# Altium footprint library Mylib.PcbLib: 294 footprints (part 2 of 19)
Each footprint in its own frame and in the unit in brackets; x right, y up, seen from the top. Pads: shape width x height; smd on the part's side, far side on the other; paste and mask are expansions set on the pad; w line width, h text height; cw(c..) or ccw(c..) is an arc to the next point about the centre after c.
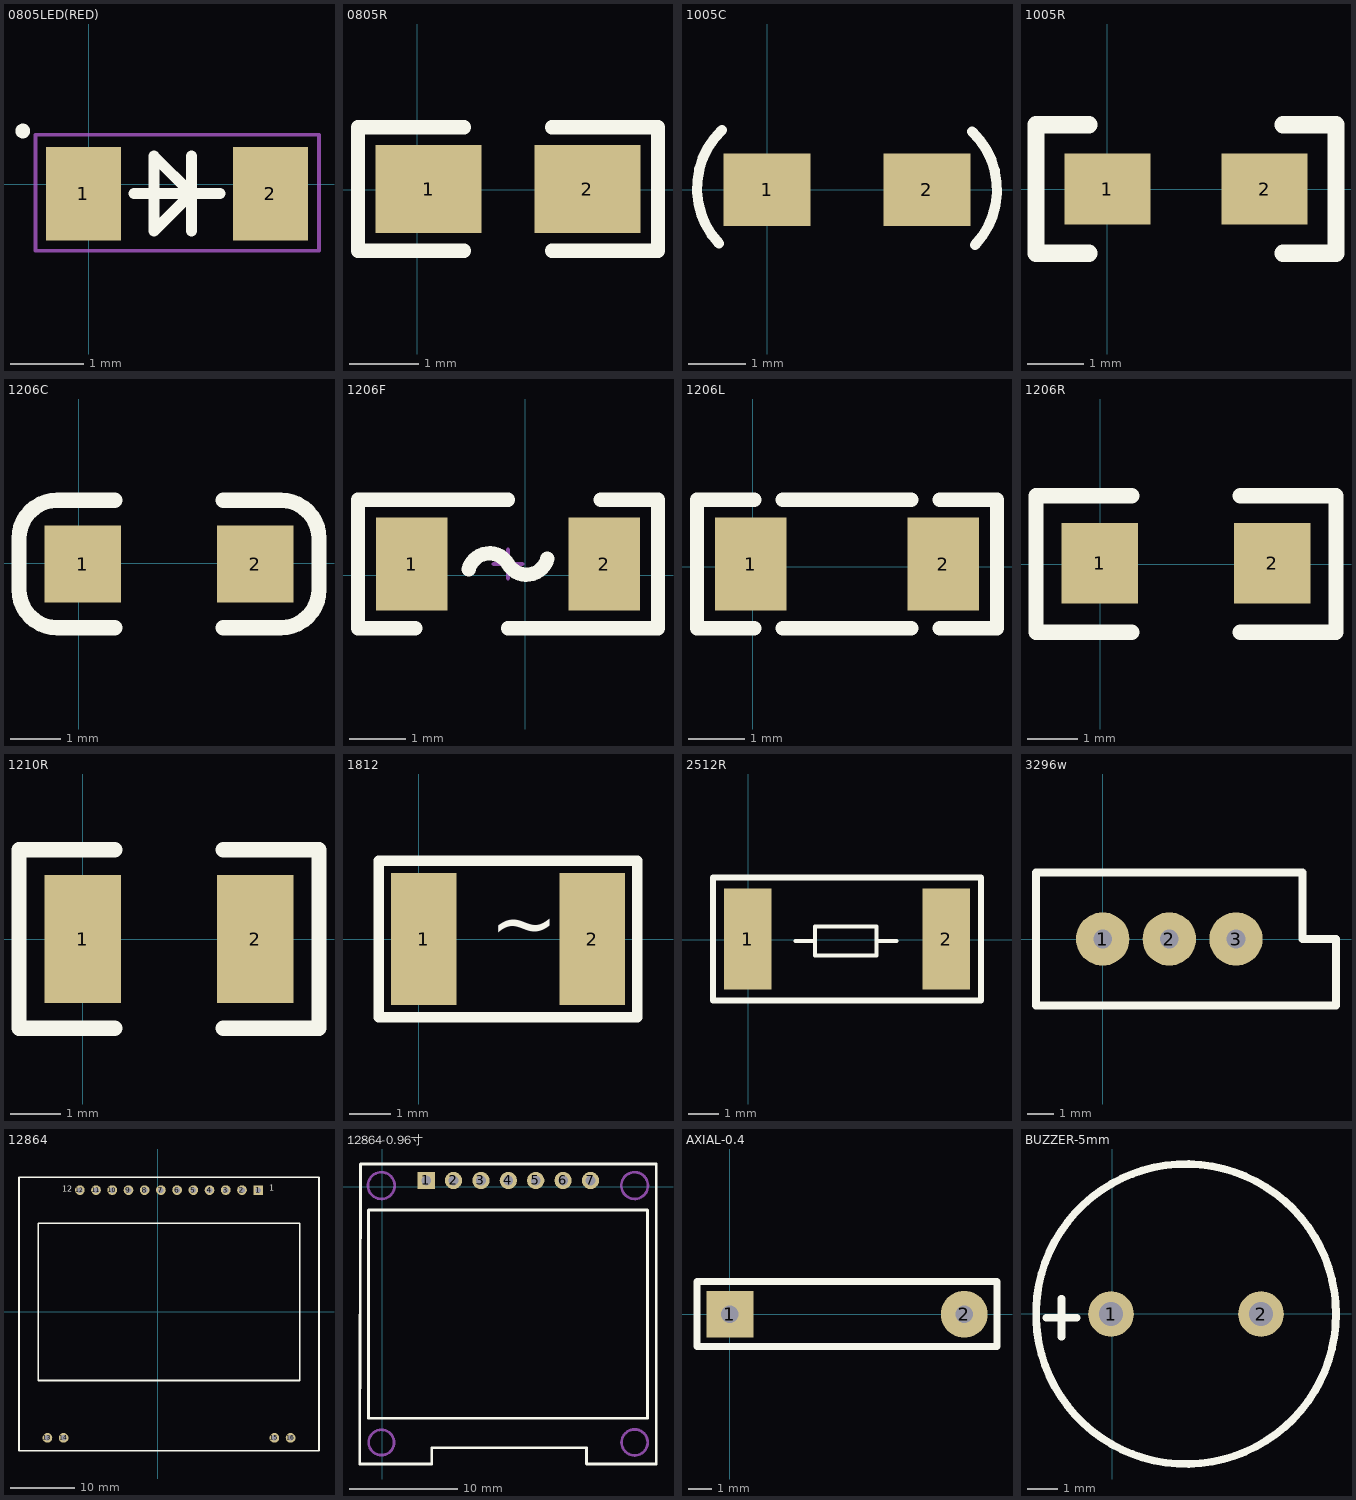
[diagram p1: the footprints below, top view; thin cyan lines are the x and y axes]

## 0805LED(RED) [mil]
pads (2):
  rect 40x50 smd: 1(-2.98,-4.95) 2(97.02,-4.95)
Top Overlay:
  circle w3.94: c-35.43,28.54 r1.97
  lines w5.91: 24.02,-4.95 70.02,-4.95 ; 54.89,-24.95 54.89,15.05 ; 34.89,-24.95 54.89,-4.95 34.89,15.05 34.89,-24.95
Mechanical 15:
  lines w1.97: -28.54,-35.43 113.74,-35.43 123.03,-35.43 123.03,26.57 -28.54,26.57 -28.54,-35.43
3D body "User Library-LTST-C190EKT.STEP": height 35.43, standoff 0, extent 12.79,-24.6 79.73,10.83

## 0805R [mil]
pads (2):
  rect 60x50 smd: 1(6.34,0.5) 2(96.34,0.5)
Top Overlay:
  lines w8: 26.34,-34.5 -33.66,-34.5 -33.66,35.5 26.34,35.5 ; 76.34,-34.5 136.34,-34.5 136.34,35.5 76.34,35.5
3D body "0805(2012M).STEP": height 31.1, standoff 0, extent 1.97,-24.5 100.72,24.5

## 1005C [mil]
pads (2):
  rect 60x50 smd: 1(0,0) 2(110,0)
Top Overlay:
  lines w7: -33,-37 cw(c7,1) -31,41 ; 141,40 cw(c103,0) 143,-38

## 1005R [mil]
pads (2):
  rect 60x50 smd: 1(0,0) 2(110,0)
Top Overlay:
  lines w12: -13,-45 -50,-45 -50,45 -13,45 ; 123,-45 160,-45 160,45 123,45

## 1206C [mil]
pads (2):
  rect 60x60 smd: 1(3.11,-0.63) 2(138.11,-0.63)
Top Overlay:
  lines w12: 28.11,-50.63 -16.89,-50.63 cw(c-16.89,-20.63) -46.89,-20.63 -46.89,19.37 cw(c-16.89,19.37) -16.89,49.37 28.11,49.37 ; 113.11,-50.63 158.11,-50.63 ccw(c158.11,-20.63) 188.11,-20.63 188.11,19.37 ccw(c158.11,19.37) 158.11,49.37 ; 158.11,49.37 113.11,49.37 158.11,49.37
3D body "1206 SMD Capacitor.STEP": height 39.45, standoff 0, extent 5.12,-32.12 131.11,30.87

## 1206F [mil] "保险丝"
pads (2):
  rect 50x65 smd: 1(-79.5,8) 2(55.5,8)
Top Overlay:
  lines w10: -102,53 -12,53 ; -77,-37 -117,-37 -117,53 -77,53 ; -39.48,4.38 cw(c-24.99,0.5) -12,8 ccw(c0.99,15.5) 15.48,11.62 ; -12,-37 78,-37 ; 53,-37 93,-37 93,53 53,53
Mechanical 15:
  lines w3: -22,8 -2,8 ; -12,-2 -12,18
3D body "FU 01206.STEP": height 34.25, standoff 0, extent -74.99,-23.89 50.99,39.89

## 1206L [mil]
pads (2):
  rect 50x65 smd: 1(-1.59,1.89) 2(133.41,1.89)
Top Overlay:
  lines w10: 0.91,-43.11 -39.09,-43.11 -39.09,46.89 0.91,46.89 ; 20.91,-43.11 110.91,-43.11 ; 20.91,46.89 110.91,46.89 ; 130.91,-43.11 170.91,-43.11 170.91,46.89 130.91,46.89
3D body "1206L.STEP": height 35.43, standoff 0, extent 2.91,-28.11 128.9,34.88

## 1206R [mm]
pads (2):
  rect 1.524x1.6 smd: 1(-0.005,0.019) 2(3.424,0.019)
Top Overlay:
  lines w0.305: 0.63,-1.353 -1.275,-1.353 -1.275,1.365 0.63,1.365 ; 2.789,-1.353 4.694,-1.353 4.694,1.365 2.789,1.365
3D body "R1206.STEP": height 0.6, standoff 0, extent 0.173,-0.781 3.373,0.819

## 1210R [mil]
pads (2):
  rect 60x100 smd: 1(0,0) 2(135,0)
Top Overlay:
  lines w12: 25,-70 -50,-70 -50,70 25,70 ; 110,-70 185,-70 185,70 110,70
3D body "RES1210.STEP": height 67.1, standoff 0, extent -11.74,-48.99 145.76,49

## 1812 [mm]
pads (2):
  rect 1.6x3.2 smd: 1(0.127,0) 2(4.227,0)
Top Overlay:
  lines w0.254: -0.973,-1.9 -0.973,1.9 5.327,1.9 5.327,-1.9 -0.973,-1.9
  text "~" at 1.727,-0.787 h2.5
3D body "Resistor 1812 SMD.step": height 1.6, standoff 0, extent -0.066,-1.6 4.434,1.6

## 2512R [mil]
pads (2):
  rect 61x129.92 smd: 1(-1.11,1) 2(253.89,1)
Top Overlay:
  lines w5.12: 60.04,-1.61 85.63,-1.61 ; 164.37,-1.61 189.96,-1.61 ; 85.63,-20.31 85.63,17.09 164.37,17.09 164.37,-20.31 85.63,-20.31
  lines w7.87: -45.39,-77.74 -45.39,79.74 298.17,79.74 298.17,-77.74 -45.39,-77.74
3D body "User Library-res2512_body.step": height 24.44, standoff 0, extent 2,-64 250.79,62

## 3296w [mil]
pads (3):
  round 80 hole 28: 1(0,0) 2(100,0) 3(200,0)
Top Overlay:
  lines w12: -100,-100 -100,100 300,100 300,0 350,0 350,-100 -100,-100
3D body "CERMET TRIMMER SINGLE TURN 10MM 500MW SIDE ADJUST 3386W.step": height 375.2, standoff -196.85, extent -87.6,-96.16 287.6,94

## 12864 [mil]
pads (16):
  rect 60x60 hole 35: 1(620,748.78)
  round 60 hole 35: 2(520,748.78) 3(420,748.78) 4(320,748.78) 5(220,748.78) 6(120,748.78) 7(20,748.78) 8(-80,748.78) 9(-180,748.78) 10(-280,748.78) 11(-380,748.78) 12(-480,748.78) 13(-680,-778.78) 14(-580,-778.78) 15(720,-778.78) 16(820,-778.78)
Top Overlay:
  lines w10: -855.2,-857.52 -855.2,827.52 995.2,827.52 995.2,-857.52 -855.2,-857.52 ; -735.91,-424.84 -735.91,544.45 875.91,544.45 875.91,-424.84 -735.91,-424.84
  text "12" at -588.2,726.48 h60
  text "1" at 689.8,733.48 h60
3D body "HDR1X8_2.54mm.STEP": height 118.11, standoff -336.22, extent -522,695 278,795
3D body "HDR1X4_2.54mm.STEP": height 118.11, standoff -336.22, extent 278,695 678,795
3D body: height 30, standoff 0, extent -856,-861 994,830
3D body: height 45, standoff 30, extent -744,-427 879,545

## 12864-0.96寸 [mm]
pads (7):
  rect 1.6x1.6 hole 0.9: 1(4.061,0.59)
  round 1.6 hole 0.9: 2(6.601,0.59) 3(9.141,0.59) 4(11.681,0.59) 5(14.221,0.59) 6(16.761,0.59) 7(19.301,0.59)
Top Overlay:
  lines w0.254: -1.289,-2.232 -1.289,-21.46 24.592,-21.46 24.592,-2.156 -1.289,-2.156 ; 25.392,2.101 25.392,-25.699 18.92,-25.699 18.92,-24.199 4.592,-24.199 4.592,-25.699 -2.089,-25.699 -2.028,2.114 25.392,2.114
Mechanical 13:
  circle w0.254: c23.392,0.114 r1.238
  circle w0.254: c-0.089,0.114 r1.239
  circle w0.254: c23.392,-23.699 r1.208
  circle w0.254: c-0.089,-23.699 r1.176
3D body "User Library-128x64I2COLEDDisplayAdafruit.step": height 2.67, standoff -8.17, extent -1.724,-25.564 24.976,2.296
3D body: height 0.25, standoff 0, extent -2.035,2.368 -2.035,2.368

## AXIAL-0.4 [mil]
pads (2):
  rect 80x80 hole 30: 1(0,0)
  round 80 hole 30: 2(400,0)
Top Overlay:
  lines w12: -56,-55 456,-55 456,56 -56,56 -56,-55
3D body: height 139.21, standoff -100, extent -13.17,-68.75 408.83,69.88

## BUZZER-5mm [mil]
pads (2):
  round 60 hole 32 mask+0: 1(-1.46,-0.35) 2(195.39,-0.35)
Top Overlay:
  circle w10: c96.97,-0.35 r196.85
  lines w10: -86.46,-5.35 -46.46,-5.35 ; -66.46,-30.35 -66.46,19.65
3D body "蜂?": height 354.33, standoff -78.74, extent -142.67,-236.57 329.77,235.87